# Altium footprint library AMLB_v1.PcbLib: 167 footprints (part 5 of 11)
Each footprint in its own frame and in the unit in brackets; x right, y up, seen from the top. Pads: shape width x height; smd on the part's side, far side on the other; paste and mask are expansions set on the pad; w line width, h text height; cw(c..) or ccw(c..) is an arc to the next point about the centre after c.
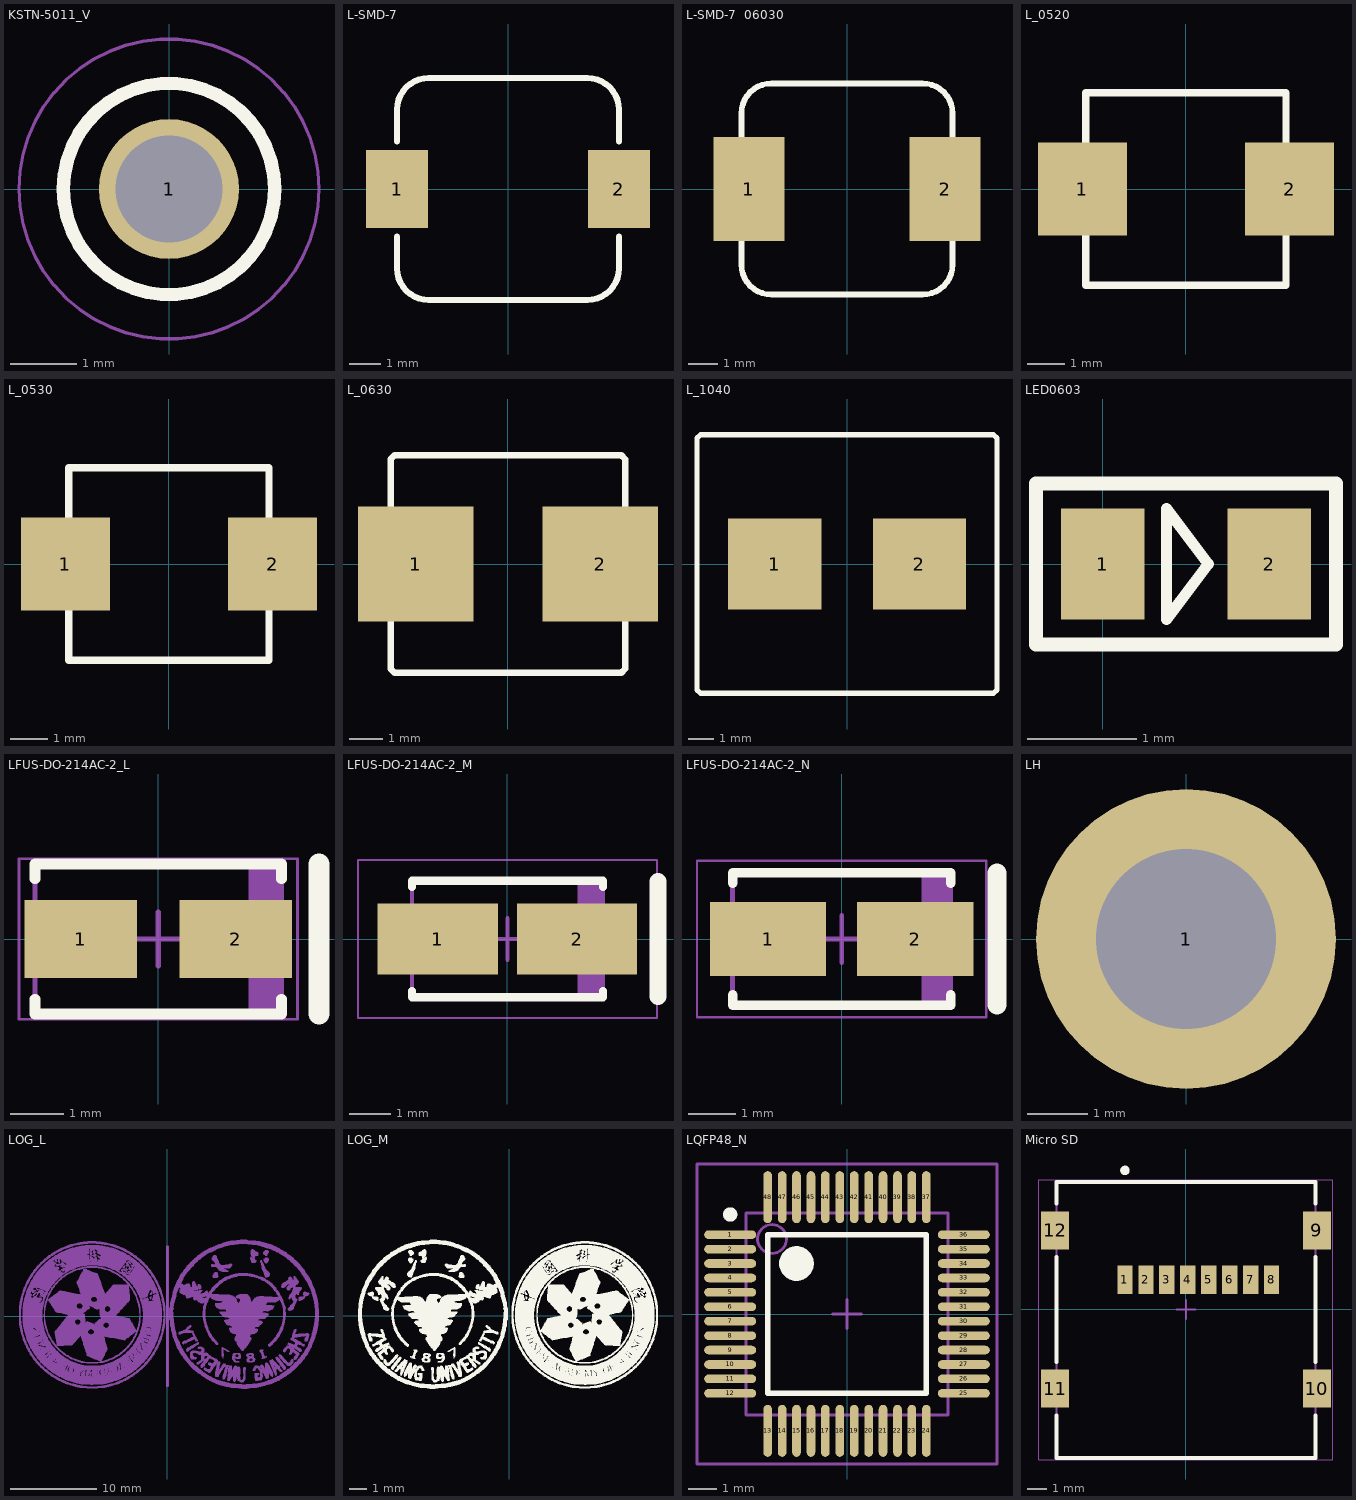
[diagram p4: the footprints below, top view; thin cyan lines are the x and y axes]

## KSTN-5011_V [mm] "Test Point, Dia 3.17mm"
height 8.28
pads (1):
  round 2.1 hole 1.6: 1(0,0)
Top Overlay:
  circle w0.2: c0,0 r1.585
Mechanical 13:
  circle w0.1: c0,0 r1.585
Mechanical 15:
  circle w0.05: c0,0 r2.25
  lines w0.1: -0.5,0 0.5,0 ; 0,-0.5 0,0.5
3D body "keystone-PN5011.STEP": height 8.13, standoff -3.17, extent -1.587,-1.587 1.588,1.588

## L-SMD-7 [mm] "贴片电感7*7"
pads (2):
  rect 2x2.5 smd: 1(-3.556,0) 2(3.556,0)
Top Overlay:
  lines w0.2: -3.556,-1.524 -3.556,-2.54 ccw(c-2.54,-2.54) -2.54,-3.556 2.54,-3.556 ccw(c2.54,-2.54) 3.556,-2.54 3.556,-1.524 ; -3.556,1.524 -3.556,2.54 cw(c-2.54,2.54) -2.54,3.556 2.54,3.556 cw(c2.54,2.54) 3.556,2.54 3.556,1.524
3D body: height 4, standoff 0, extent -3.556,-3.556 3.556,3.556

## L-SMD-7  06030 [mm] "贴片电感7*7"
height 3
pads (2):
  rect 2.4x3.5 smd: 1(-3.3,0) 2(3.3,0)
Top Overlay:
  lines w0.2: -3.556,-1.524 -3.556,-2.54 ccw(c-2.54,-2.54) -2.54,-3.556 2.54,-3.556 ccw(c2.54,-2.54) 3.556,-2.54 3.556,-1.524 ; -3.556,1.524 -3.556,2.54 cw(c-2.54,2.54) -2.54,3.556 2.54,3.556 cw(c2.54,2.54) 3.556,2.54 3.556,1.524
3D body: height 4, standoff 0, extent -3.556,-3.556 3.556,3.556

## L_0520 [mm] "AMPI053 0ED; 5.2*5.4*2.8"
height 2.8
pads (2):
  rect 2.4x2.5 smd: 1(-2.794,0) 2(2.8,0)
Top Overlay:
  lines w0.2: -2.7,-2.6 -2.7,2.6 2.7,2.6 2.7,-2.6 -2.7,-2.6
3D body: height 4, standoff 0, extent -3.556,-3.556 3.556,3.556

## L_0530 [mm] "AMPI053 0ED; 5.2*5.4*2.8"
height 2.8
pads (2):
  rect 2.4x2.5 smd: 1(-2.794,0) 2(2.8,0)
Top Overlay:
  lines w0.2: -2.7,-2.6 -2.7,2.6 2.7,2.6 2.7,-2.6 -2.7,-2.6
3D body: height 4, standoff 0, extent -3.556,-3.556 3.556,3.556

## L_0630 [mm] "AMPI063 0ED; 6.6*7.1*0.3"
height 3
pads (2):
  rect 3.5x3.5 smd: 1(-2.794,0) 2(2.8,0)
Top Overlay:
  lines w0.2: -3.556,-3.175 -3.556,3.175 -3.429,3.302 3.429,3.302 3.556,3.175 3.556,-3.175 3.429,-3.302 -3.429,-3.302 -3.556,-3.175
3D body: height 4, standoff 0, extent -3.556,-3.556 3.556,3.556

## L_1040 [mm] "AMPI104 0ED; 10*11.5*3.8"
height 3.8
pads (2):
  rect 3.6x3.5 smd: 1(-2.794,0) 2(2.8,0)
Top Overlay:
  lines w0.2: -5.8,-4.868 -5.668,-5 5.668,-5 5.8,-4.868 5.8,4.868 5.668,5 -5.668,5 -5.8,4.868 -5.8,-4.868
3D body: height 4, standoff 0, extent -3.556,-3.556 3.556,3.556

## LED0603 [mil]
pads (2):
  rect 30x40 smd: 1(0,0) 2(60,0)
Top Overlay:
  lines w4: 23.01,-20 23.01,20 38.01,0 23.01,-20
  lines w5: -24,-29 -24,29 84,29 84,-29 -24,-29

## LFUS-DO-214AC-2_L [mm] "Molded Diode, 2-Leads, Body 4.6x2.79mm, IPC High Density"
height 2.29
pads (2):
  rect 2.1x1.45 smd: 1(-1.45,0) 2(1.45,0)
Top Overlay:
  lines w0.2: -2.3,-1.125 -2.3,-1.4 2.3,-1.4 2.3,-1.125 ; -2.3,1.125 -2.3,1.4 2.3,1.4 2.3,1.125
  lines w0.4: 3,-1.395 3,1.395
Mechanical 13:
  rectangle: 1.681,-1.395 2.3,1.395
  lines w0.1: -2.3,-1.395 -2.3,1.395 2.3,1.395 2.3,-1.395 -2.3,-1.395
Mechanical 15:
  lines w0.05: -2.6,-1.5 -2.6,1.5 2.6,1.5 2.6,-1.5 -2.6,-1.5
  lines w0.1: -0.5,0 0.5,0 ; 0,-0.5 0,0.5
3D body "DIOM4326X23L.step": height 2.29, standoff 0, extent -2.52,-1.395 2.52,1.395

## LFUS-DO-214AC-2_M [mm] "Molded Diode, 2-Leads, Body 4.6x2.79mm, IPC Low Density"
height 2.29
pads (2):
  rect 2.9x1.7 smd: 1(-1.675,0) 2(1.675,0)
Top Overlay:
  lines w0.2: -2.3,-1.25 -2.3,-1.4 2.3,-1.4 2.3,-1.25 ; -2.3,1.25 -2.3,1.4 2.3,1.4 2.3,1.25
  lines w0.4: 3.625,-1.395 3.625,1.395
Mechanical 13:
  rectangle: 1.681,-1.395 2.3,1.395
  lines w0.1: -2.3,-1.395 2.3,-1.395 2.3,1.395 -2.3,1.395 -2.3,-1.395
Mechanical 15:
  lines w0.05: -3.6,-1.9 3.6,-1.9 3.6,1.9 -3.6,1.9 -3.6,-1.9
  lines w0.1: -0.5,0 0.5,0 ; 0,-0.5 0,0.5
3D body "DIOM4326X23M.step": height 2.29, standoff 0, extent -2.52,-1.395 2.52,1.395

## LFUS-DO-214AC-2_N [mm] "Molded Diode, 2-Leads, Body 4.6x2.79mm, IPC Medium Density"
height 2.29
pads (2):
  rect 2.45x1.55 smd: 1(-1.55,0) 2(1.55,0)
Top Overlay:
  lines w0.2: -2.3,-1.175 -2.3,-1.4 2.3,-1.4 2.3,-1.175 ; -2.3,1.175 -2.3,1.4 2.3,1.4 2.3,1.175
  lines w0.4: 3.275,-1.395 3.275,1.395
Mechanical 13:
  rectangle: 1.681,-1.395 2.3,1.395
  lines w0.1: -2.3,-1.395 -2.3,1.395 2.3,1.395 2.3,-1.395 -2.3,-1.395
Mechanical 15:
  lines w0.05: -3.05,-1.65 -3.05,1.65 3.05,1.65 3.05,-1.65 -3.05,-1.65
  lines w0.1: -0.5,0 0.5,0 ; 0,-0.5 0,0.5
3D body "DIOM4326X23N.step": height 2.29, standoff 0, extent -2.52,-1.395 2.52,1.395

## LH [mm]
pads (1):
  round 5 hole 3: 1(0,0)

## LOG_L [mm]
Bottom Overlay:
  drawing of 5493 lines, arcs and shapes, not listed

## LOG_M [mm]
Top Overlay:
  drawing of 5491 lines, arcs and shapes, not listed

## LQFP48_N [mm]
height 0.559
pads (48):
  oval 1.8x0.3 smd: 1(-4.05,2.75) 2(-4.05,2.25) 3(-4.05,1.75) 4(-4.05,1.25) 5(-4.05,0.75) 6(-4.05,0.25) 7(-4.05,-0.25) 8(-4.05,-0.75) 9(-4.05,-1.25) 10(-4.05,-1.75) 11(-4.05,-2.25) 12(-4.05,-2.75) 25(4.05,-2.75) 26(4.05,-2.25) 27(4.05,-1.75) 28(4.05,-1.25) 29(4.05,-0.75) 30(4.05,-0.25) 31(4.05,0.25) 32(4.05,0.75) 33(4.05,1.25) 34(4.05,1.75) 35(4.05,2.25) 36(4.05,2.75)
  oval 0.3x1.8 smd: 13(-2.75,-4.05) 14(-2.25,-4.05) 15(-1.75,-4.05) 16(-1.25,-4.05) 17(-0.75,-4.05) 18(-0.25,-4.05) 19(0.25,-4.05) 20(0.75,-4.05) 21(1.25,-4.05) 22(1.75,-4.05) 23(2.25,-4.05) 24(2.75,-4.05) 37(2.75,4.05) 38(2.25,4.05) 39(1.75,4.05) 40(1.25,4.05) 41(0.75,4.05) 42(0.25,4.05) 43(-0.25,4.05) 44(-0.75,4.05) 45(-1.25,4.05) 46(-1.75,4.05) 47(-2.25,4.05) 48(-2.75,4.05)
Top Overlay:
  circle w0.25: c-4.05,3.45 r0.125
  circle w0.6: c-1.75,1.75 r0.3
  lines w0.2: -2.75,-2.75 -2.75,2.75 2.75,2.75 2.75,-2.75 -2.75,-2.75
Mechanical 13:
  circle w0.1: c-2.6,2.6 r0.5
  lines w0.1: -3.5,-3.5 -3.5,3.5 3.5,3.5 3.5,-3.5 -3.5,-3.5
Mechanical 15:
  lines w0.1: -0.5,0 0.5,0 ; 0,-0.5 0,0.5 ; -5.2,-5.2 -5.2,5.2 5.2,5.2 5.2,-5.2 -5.2,-5.2

## Micro SD [mm] "CONN, 8-Leads, Body 14.5x13.6mm, Pitch 1.1mm"
height 1.9
pads (12):
  rect 0.8x1.5 smd: 1(-3.205,1.55) 2(-2.105,1.55) 3(-1.005,1.55) 4(0.095,1.55) 5(1.195,1.55) 6(2.295,1.55) 7(3.395,1.55) 8(4.495,1.55)
  rect 1.45x2 smd: 9(6.875,4.15) 10(6.875,-4.15) 11(-6.875,-4.15) 12(-6.875,4.15)
Top Overlay:
  circle w0.25: c-3.205,7.3 r0.125
  lines w0.2: -6.8,-5.55 -6.8,-7.8 6.8,-7.8 6.8,-5.55 ; -6.8,-2.75 -6.8,2.75 ; -6.8,5.55 -6.8,6.7 6.8,6.7 6.8,5.55 ; 6.8,-2.75 6.8,2.75
Mechanical 13:
  lines w0.1: -6.8,-7.8 6.8,-7.8 6.8,6.7 -6.8,6.7 -6.8,-7.8
Mechanical 15:
  lines w0.05: -7.725,-7.9 7.7,-7.9 7.7,6.8 -7.725,6.8 -7.725,-7.9
  lines w0.1: -0.5,0 0.5,0 ; 0,-0.5 0,0.5
3D body "472192001.stp": height 1.91, standoff 0.02, extent -7.3,-7.793 7.3,6.707